# Altium footprint library PcbLib.PcbLib: 15 footprints
Each footprint in its own frame and in the unit in brackets; x right, y up, seen from the top. Pads: shape width x height; smd on the part's side, far side on the other; paste and mask are expansions set on the pad; w line width, h text height; cw(c..) or ccw(c..) is an arc to the next point about the centre after c.
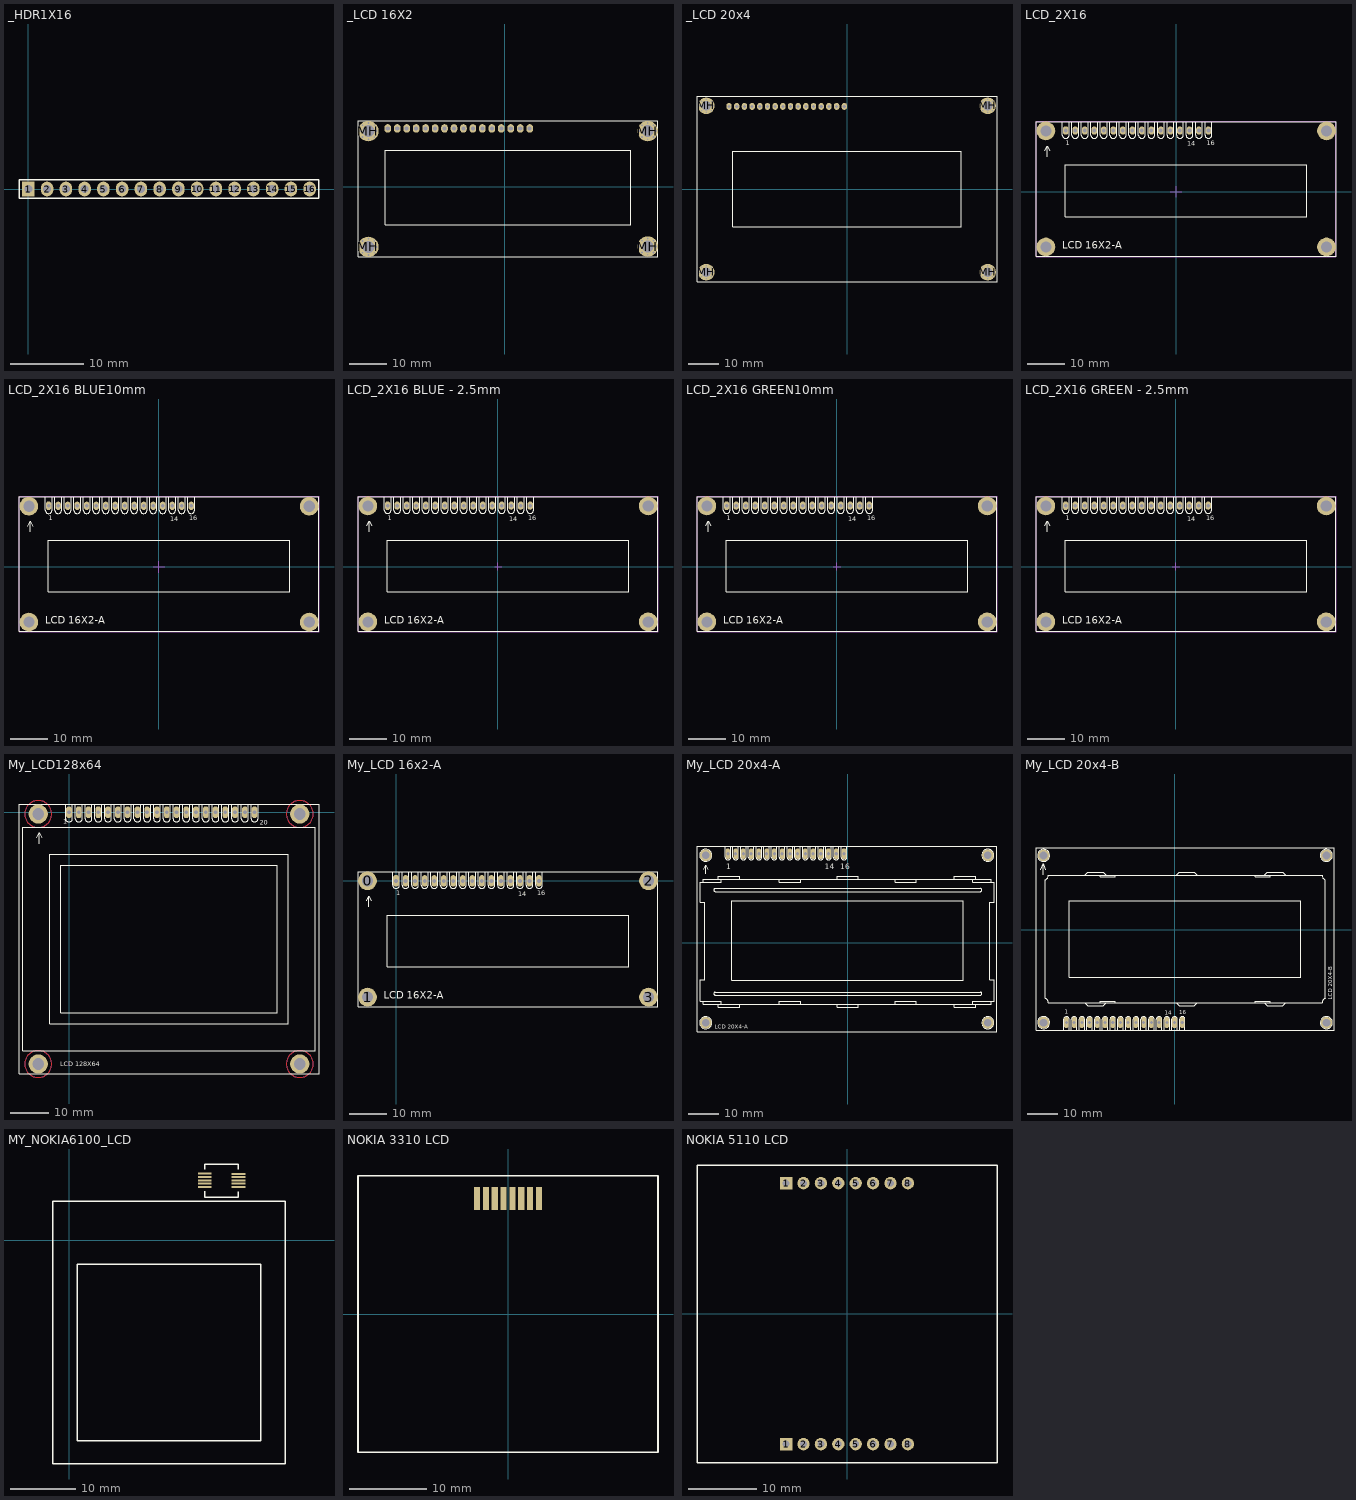
[diagram p0: the footprints below, top view; thin cyan lines are the x and y axes]

## _HDR1X16 [mm] "Connector; Header; 16 Position"
pads (16):
  rect 1.7x2 hole 1.1: 1(0,0)
  oval 1.7x2 hole 1.1: 2(2.54,0) 3(5.08,0) 4(7.62,0) 5(10.16,0) 6(12.7,0) 7(15.24,0) 8(17.78,0) 9(20.32,0) 10(22.86,0) 11(25.4,0) 12(27.94,0) 13(30.48,0) 14(33.02,0) 15(35.56,0) 16(38.1,0)
Top Overlay:
  lines w0.2: -1.27,-1.27 -1.27,1.27 0.635,1.27 39.37,1.27 39.37,-1.27 -1.27,-1.27

## _LCD 16X2 [mm]
pads (52):
  oval 1.778x2.286 hole 1.1: 1(-31.445,15.672) 2(-28.905,15.672) 3(-26.365,15.672) 4(-23.825,15.672) 5(-21.285,15.672) 6(-18.745,15.672) 7(-16.205,15.672) 8(-13.665,15.672) 9(-11.125,15.672) 10(-8.585,15.672) 11(-6.045,15.672) 12(-3.505,15.672) 13(-0.965,15.672) 14(1.575,15.672) 15(4.115,15.672) 16(6.655,15.672)
  round 0.6 hole 0.5: MH(-38.845,-16.128) MH(-38.845,14.972) MH(-38.201,-17.684) MH(-38.201,-14.573) MH(-38.201,13.416) MH(-38.201,16.527) MH(-36.645,-18.328) MH(-36.645,-13.928) MH(-36.645,12.772) MH(-36.645,17.172) MH(-35.09,-17.684) MH(-35.09,-14.573) MH(-35.09,13.416) MH(-35.09,16.527) MH(-34.445,-16.128) MH(-34.445,14.972) MH(36.155,-16.028) MH(36.155,14.972) MH(36.799,-17.584) MH(36.799,-14.473) MH(36.799,13.416) MH(36.799,16.527) MH(38.355,-18.228) MH(38.355,-13.828) MH(38.355,12.772) MH(38.355,17.172) MH(39.91,-17.584) MH(39.91,-14.473) MH(39.91,13.416) MH(39.91,16.527) MH(40.555,-16.028) MH(40.555,14.972)
  round 5.5 hole 3.2: MH(-36.645,-16.128) MH(-36.645,14.972) MH(38.355,-16.028) MH(38.355,14.972)
Top Overlay:
  lines w0.254: -39.437,-18.796 41.063,-18.796 41.063,17.704 -39.437,17.704 -39.437,-18.796 ; -32.145,-10.228 33.855,-10.228 33.855,9.772 -32.145,9.772 -32.145,-10.228

## _LCD 20x4 [mm]
pads (52):
  oval 1.778x2.286 hole 1.016: 1(-39,27.3) 2(-36.46,27.3) 3(-33.92,27.3) 4(-31.38,27.3) 5(-28.84,27.3) 6(-26.3,27.3) 7(-23.76,27.3) 8(-21.22,27.3) 9(-18.68,27.3) 10(-16.14,27.3) 11(-13.6,27.3) 12(-11.06,27.3) 13(-8.52,27.3) 14(-5.98,27.3) 15(-3.44,27.3) 16(-0.9,27.3)
  round 1 hole 0.5: MH(-48.7,-27.5) MH(-48.7,27.5) MH(-48.056,-29.056) MH(-48.056,-25.944) MH(-48.056,25.944) MH(-48.056,29.056) MH(-46.5,-29.7) MH(-46.5,-25.3) MH(-46.5,25.3) MH(-46.5,29.7) MH(-44.944,-29.056) MH(-44.944,-25.944) MH(-44.944,25.944) MH(-44.944,29.056) MH(-44.3,-27.5) MH(-44.3,27.5) MH(44.3,-27.5) MH(44.3,27.5) MH(44.944,-29.056) MH(44.944,-25.944) MH(44.944,25.944) MH(44.944,29.056) MH(46.5,-29.7) MH(46.5,-25.3) MH(46.5,25.3) MH(46.5,29.7) MH(48.056,-29.056) MH(48.056,-25.944) MH(48.056,25.944) MH(48.056,29.056) MH(48.7,-27.5) MH(48.7,27.5)
  round 5.5 hole 3.2: MH(-46.5,-27.5) MH(-46.5,27.5) MH(46.5,-27.5) MH(46.5,27.5)
Top Overlay:
  lines w0.254: -49.6,-30.6 -49.6,30.6 49.6,30.6 49.6,-30.6 -49.6,-30.6 ; -37.8,-12.5 -37.8,12.5 37.8,12.5 37.8,-12.5 -37.8,-12.5
3D body "14801-15 H.STEP": height 18.71, standoff -3.71, extent 44.2,25.2 48.8,29.8
3D body "14801-15 H.STEP": height 18.71, standoff -3.71, extent 44.2,-29.8 48.8,-25.2
3D body "14801-15 H.STEP": height 18.71, standoff -3.71, extent -48.8,-29.8 -44.2,-25.2
3D body "14801-15 H.STEP": height 18.71, standoff -3.71, extent -48.8,25.2 -44.2,29.8

## LCD_2X16 [mm] "LCD 2x16 Alphanumberic-Designer Abbas Basereh"
height 50
pads (20):
  oct 1.5x2.2 hole 1: 1(-29.464,16.3)
  oval 1.5x2.2 hole 1: 2(-26.924,16.3) 3(-24.384,16.3) 4(-21.844,16.3) 5(-19.304,16.3) 6(-16.764,16.3) 7(-14.224,16.3) 8(-11.684,16.3) 9(-9.144,16.3) 10(-6.604,16.3) 11(-4.064,16.3) 12(-1.524,16.3) 13(1.016,16.3) 14(3.556,16.3) 15(6.096,16.3) 16(8.636,16.3)
  round 5 hole 3: ""(-34.756,-14.775) ""(-34.756,16.213) ""(40.174,-14.775) ""(40.174,16.213)
Top Overlay:
  circle w0.2: c-34.796,-14.788 r1.25
  circle w0.2: c40.204,-14.788 r1.25
  circle w0.2: c-34.796,16.213 r1.25
  circle w0.2: c40.204,16.213 r1.25
  lines w0.2: -35.01,10.879 -34.375,12.149 -33.74,10.879 ; -34.375,9.337 -34.375,12.022 ; -30.353,18.669 -30.353,15.113 ccw(c-29.464,15.113) -28.575,15.113 -28.575,18.669 ; -27.813,18.669 -27.813,15.113 ccw(c-26.924,15.113) -26.035,15.113 -26.035,18.669 ; -25.273,18.669 -25.273,15.113 ccw(c-24.384,15.113) -23.495,15.113 -23.495,18.669 ; -22.733,18.669 -22.733,15.113 ccw(c-21.844,15.113) -20.955,15.113 -20.955,18.669 ; -20.193,18.669 -20.193,15.113 ccw(c-19.304,15.113) -18.415,15.113 -18.415,18.669 ; -17.653,18.669 -17.653,15.113 ccw(c-16.764,15.113) -15.875,15.113 -15.875,18.669 ; -15.113,18.669 -15.113,15.113 ccw(c-14.224,15.113) -13.335,15.113 -13.335,18.669 ; -12.573,18.669 -12.573,15.113 ccw(c-11.684,15.113) -10.795,15.113 -10.795,18.669 ; -10.033,18.669 -10.033,15.113 ccw(c-9.144,15.113) -8.255,15.113 -8.255,18.669 ; -7.493,18.669 -7.493,15.113 ccw(c-6.604,15.113) -5.715,15.113 -5.715,18.669 ; -4.953,18.669 -4.953,15.113 ccw(c-4.064,15.113) -3.175,15.113 -3.175,18.669 ; -2.413,18.669 -2.413,15.113 ccw(c-1.524,15.113) -0.635,15.113 -0.635,18.669 ; 0.127,18.669 0.127,15.113 ccw(c1.016,15.113) 1.905,15.113 1.905,18.669 ; 2.667,18.669 2.667,15.113 ccw(c3.556,15.113) 4.445,15.113 4.445,18.669 ; 5.207,18.669 5.207,15.113 ccw(c6.096,15.113) 6.985,15.113 6.985,18.669 ; 7.747,18.669 7.747,15.113 ccw(c8.636,15.113) 9.525,15.113 9.525,18.669 ; -37.296,-17.288 42.704,-17.288 42.704,18.712 -37.296,18.712 -37.296,-17.288 ; -29.546,-6.688 -29.546,7.112 34.954,7.112 34.954,-6.688 -29.546,-6.688
  text "14" at 3.048,12.192 h1.27
  text "1" at -29.464,12.446 h1.27
  text "16" at 8.128,12.446 h1.27
  text "LCD 16X2-A" at -30.438,-15.283 h1.91
Mechanical 15:
  lines w0.15: -1.5,0 1.5,0 ; 0,-1.5 0,1.5 ; -37.4,-17.4 42.7,-17.4 42.7,18.8 -37.4,18.8 -37.4,-17.4
3D body "User Library-AC162B.STEP": height 21, standoff 7.1, extent -37.35,-17.3 42.65,18.7
3D body: height 10, standoff 0, extent -37.338,13.589 -32.131,18.796
3D body: height 10, standoff 0, extent -37.338,-17.399 -32.131,-12.192
3D body: height 10, standoff 0, extent 37.592,-17.399 42.799,-12.192
3D body: height 10, standoff 0, extent 37.592,13.589 42.799,18.796

## LCD_2X16 BLUE10mm [mm] "LCD 2x16 Alphanumberic-Designer Abbas Basereh"
height 50
pads (20):
  oct 1.5x2.2 hole 1: 1(-29.464,16.3)
  oval 1.5x2.2 hole 1: 2(-26.924,16.3) 3(-24.384,16.3) 4(-21.844,16.3) 5(-19.304,16.3) 6(-16.764,16.3) 7(-14.224,16.3) 8(-11.684,16.3) 9(-9.144,16.3) 10(-6.604,16.3) 11(-4.064,16.3) 12(-1.524,16.3) 13(1.016,16.3) 14(3.556,16.3) 15(6.096,16.3) 16(8.636,16.3)
  round 5 hole 3: ""(-34.756,-14.775) ""(-34.756,16.213) ""(40.174,-14.775) ""(40.174,16.213)
Top Overlay:
  circle w0.2: c40.204,16.213 r1.25
  circle w0.2: c-34.796,16.213 r1.25
  circle w0.2: c40.204,-14.788 r1.25
  circle w0.2: c-34.796,-14.788 r1.25
  lines w0.2: -35.01,10.879 -34.375,12.149 -33.74,10.879 ; -34.375,9.337 -34.375,12.022 ; -30.353,18.669 -30.353,15.113 ccw(c-29.464,15.113) -28.575,15.113 -28.575,18.669 ; -27.813,18.669 -27.813,15.113 ccw(c-26.924,15.113) -26.035,15.113 -26.035,18.669 ; -25.273,18.669 -25.273,15.113 ccw(c-24.384,15.113) -23.495,15.113 -23.495,18.669 ; -22.733,18.669 -22.733,15.113 ccw(c-21.844,15.113) -20.955,15.113 -20.955,18.669 ; -20.193,18.669 -20.193,15.113 ccw(c-19.304,15.113) -18.415,15.113 -18.415,18.669 ; -17.653,18.669 -17.653,15.113 ccw(c-16.764,15.113) -15.875,15.113 -15.875,18.669 ; -15.113,18.669 -15.113,15.113 ccw(c-14.224,15.113) -13.335,15.113 -13.335,18.669 ; -12.573,18.669 -12.573,15.113 ccw(c-11.684,15.113) -10.795,15.113 -10.795,18.669 ; -10.033,18.669 -10.033,15.113 ccw(c-9.144,15.113) -8.255,15.113 -8.255,18.669 ; -7.493,18.669 -7.493,15.113 ccw(c-6.604,15.113) -5.715,15.113 -5.715,18.669 ; -4.953,18.669 -4.953,15.113 ccw(c-4.064,15.113) -3.175,15.113 -3.175,18.669 ; -2.413,18.669 -2.413,15.113 ccw(c-1.524,15.113) -0.635,15.113 -0.635,18.669 ; 0.127,18.669 0.127,15.113 ccw(c1.016,15.113) 1.905,15.113 1.905,18.669 ; 2.667,18.669 2.667,15.113 ccw(c3.556,15.113) 4.445,15.113 4.445,18.669 ; 5.207,18.669 5.207,15.113 ccw(c6.096,15.113) 6.985,15.113 6.985,18.669 ; 7.747,18.669 7.747,15.113 ccw(c8.636,15.113) 9.525,15.113 9.525,18.669 ; -37.296,-17.288 -37.296,18.712 42.704,18.712 42.704,-17.288 -37.296,-17.288 ; -29.546,-6.688 34.954,-6.688 34.954,7.112 -29.546,7.112 -29.546,-6.688
  text "LCD 16X2-A" at -30.438,-15.283 h1.91
  text "16" at 8.128,12.446 h1.27
  text "1" at -29.464,12.446 h1.27
  text "14" at 3.048,12.192 h1.27
Mechanical 15:
  lines w0.15: -1.5,0 1.5,0 ; -0.1,-1.6 -0.1,1.5 ; -37.4,-17.4 42.8,-17.4 42.8,18.9 -37.4,18.9 -37.4,-17.4
3D body: height 10, standoff 0, extent 37.592,13.589 42.799,18.796
3D body: height 10, standoff 0, extent 37.592,-17.399 42.799,-12.192
3D body: height 10, standoff 0, extent -37.338,-17.399 -32.131,-12.192
3D body: height 10, standoff 0, extent -37.338,13.589 -32.131,18.796
3D body "User Library-LCD-5.STEP": height 19.8, standoff 1.5, extent -37.35,-17.3 42.65,18.7
3D body: height 10, standoff 0, extent -30.25,15.25 9.75,17.75

## LCD_2X16 BLUE - 2.5mm [mm] "LCD 2x16 Alphanumberic-Designer Abbas Basereh"
height 40
pads (20):
  oct 1.5x2.2 hole 1: 1(-29.464,16.3)
  oval 1.5x2.2 hole 1: 2(-26.924,16.3) 3(-24.384,16.3) 4(-21.844,16.3) 5(-19.304,16.3) 6(-16.764,16.3) 7(-14.224,16.3) 8(-11.684,16.3) 9(-9.144,16.3) 10(-6.604,16.3) 11(-4.064,16.3) 12(-1.524,16.3) 13(1.016,16.3) 14(3.556,16.3) 15(6.096,16.3) 16(8.636,16.3)
  round 5 hole 3: ""(-34.756,-14.775) ""(-34.756,16.213) ""(40.174,-14.775) ""(40.174,16.213)
Top Overlay:
  circle w0.2: c40.204,16.213 r1.25
  circle w0.2: c-34.796,16.213 r1.25
  circle w0.2: c40.204,-14.788 r1.25
  circle w0.2: c-34.796,-14.788 r1.25
  lines w0.2: -35.01,10.879 -34.375,12.149 -33.74,10.879 ; -34.375,9.337 -34.375,12.022 ; -30.353,18.669 -30.353,15.113 ccw(c-29.464,15.113) -28.575,15.113 -28.575,18.669 ; -27.813,18.669 -27.813,15.113 ccw(c-26.924,15.113) -26.035,15.113 -26.035,18.669 ; -25.273,18.669 -25.273,15.113 ccw(c-24.384,15.113) -23.495,15.113 -23.495,18.669 ; -22.733,18.669 -22.733,15.113 ccw(c-21.844,15.113) -20.955,15.113 -20.955,18.669 ; -20.193,18.669 -20.193,15.113 ccw(c-19.304,15.113) -18.415,15.113 -18.415,18.669 ; -17.653,18.669 -17.653,15.113 ccw(c-16.764,15.113) -15.875,15.113 -15.875,18.669 ; -15.113,18.669 -15.113,15.113 ccw(c-14.224,15.113) -13.335,15.113 -13.335,18.669 ; -12.573,18.669 -12.573,15.113 ccw(c-11.684,15.113) -10.795,15.113 -10.795,18.669 ; -10.033,18.669 -10.033,15.113 ccw(c-9.144,15.113) -8.255,15.113 -8.255,18.669 ; -7.493,18.669 -7.493,15.113 ccw(c-6.604,15.113) -5.715,15.113 -5.715,18.669 ; -4.953,18.669 -4.953,15.113 ccw(c-4.064,15.113) -3.175,15.113 -3.175,18.669 ; -2.413,18.669 -2.413,15.113 ccw(c-1.524,15.113) -0.635,15.113 -0.635,18.669 ; 0.127,18.669 0.127,15.113 ccw(c1.016,15.113) 1.905,15.113 1.905,18.669 ; 2.667,18.669 2.667,15.113 ccw(c3.556,15.113) 4.445,15.113 4.445,18.669 ; 5.207,18.669 5.207,15.113 ccw(c6.096,15.113) 6.985,15.113 6.985,18.669 ; 7.747,18.669 7.747,15.113 ccw(c8.636,15.113) 9.525,15.113 9.525,18.669 ; -37.296,-17.288 -37.296,18.712 42.704,18.712 42.704,-17.288 -37.296,-17.288 ; -29.546,-6.688 34.954,-6.688 34.954,7.112 -29.546,7.112 -29.546,-6.688
  text "LCD 16X2-A" at -30.438,-15.283 h1.91
  text "16" at 8.128,12.446 h1.27
  text "1" at -29.464,12.446 h1.27
  text "14" at 3.048,12.192 h1.27
Mechanical 15:
  lines w0.15: -0.9,0 1,0 ; 0,-1 0,1 ; -37.4,-17.4 -37.4,18.8 42.8,18.8 42.8,-17.4 -37.4,-17.4
3D body "User Library-LCD-5.STEP": height 12.3, standoff -6, extent -37.35,-17.3 42.65,18.7

## LCD_2X16 GREEN10mm [mm] "LCD 2x16 Alphanumberic-Designer Abbas Basereh"
height 50
pads (20):
  oct 1.5x2.2 hole 1: 1(-29.464,16.3)
  oval 1.5x2.2 hole 1: 2(-26.924,16.3) 3(-24.384,16.3) 4(-21.844,16.3) 5(-19.304,16.3) 6(-16.764,16.3) 7(-14.224,16.3) 8(-11.684,16.3) 9(-9.144,16.3) 10(-6.604,16.3) 11(-4.064,16.3) 12(-1.524,16.3) 13(1.016,16.3) 14(3.556,16.3) 15(6.096,16.3) 16(8.636,16.3)
  round 5 hole 3: ""(-34.756,-14.775) ""(-34.756,16.213) ""(40.174,-14.775) ""(40.174,16.213)
Top Overlay:
  circle w0.2: c-34.796,-14.788 r1.25
  circle w0.2: c40.204,-14.788 r1.25
  circle w0.2: c-34.796,16.213 r1.25
  circle w0.2: c40.204,16.213 r1.25
  lines w0.2: -35.01,10.879 -34.375,12.149 -33.74,10.879 ; -34.375,9.337 -34.375,12.022 ; -30.353,18.669 -30.353,15.113 ccw(c-29.464,15.113) -28.575,15.113 -28.575,18.669 ; -27.813,18.669 -27.813,15.113 ccw(c-26.924,15.113) -26.035,15.113 -26.035,18.669 ; -25.273,18.669 -25.273,15.113 ccw(c-24.384,15.113) -23.495,15.113 -23.495,18.669 ; -22.733,18.669 -22.733,15.113 ccw(c-21.844,15.113) -20.955,15.113 -20.955,18.669 ; -20.193,18.669 -20.193,15.113 ccw(c-19.304,15.113) -18.415,15.113 -18.415,18.669 ; -17.653,18.669 -17.653,15.113 ccw(c-16.764,15.113) -15.875,15.113 -15.875,18.669 ; -15.113,18.669 -15.113,15.113 ccw(c-14.224,15.113) -13.335,15.113 -13.335,18.669 ; -12.573,18.669 -12.573,15.113 ccw(c-11.684,15.113) -10.795,15.113 -10.795,18.669 ; -10.033,18.669 -10.033,15.113 ccw(c-9.144,15.113) -8.255,15.113 -8.255,18.669 ; -7.493,18.669 -7.493,15.113 ccw(c-6.604,15.113) -5.715,15.113 -5.715,18.669 ; -4.953,18.669 -4.953,15.113 ccw(c-4.064,15.113) -3.175,15.113 -3.175,18.669 ; -2.413,18.669 -2.413,15.113 ccw(c-1.524,15.113) -0.635,15.113 -0.635,18.669 ; 0.127,18.669 0.127,15.113 ccw(c1.016,15.113) 1.905,15.113 1.905,18.669 ; 2.667,18.669 2.667,15.113 ccw(c3.556,15.113) 4.445,15.113 4.445,18.669 ; 5.207,18.669 5.207,15.113 ccw(c6.096,15.113) 6.985,15.113 6.985,18.669 ; 7.747,18.669 7.747,15.113 ccw(c8.636,15.113) 9.525,15.113 9.525,18.669 ; -37.296,-17.288 42.704,-17.288 42.704,18.712 -37.296,18.712 -37.296,-17.288 ; -29.546,-6.688 -29.546,7.112 34.954,7.112 34.954,-6.688 -29.546,-6.688
  text "14" at 3.048,12.192 h1.27
  text "1" at -29.464,12.446 h1.27
  text "16" at 8.128,12.446 h1.27
  text "LCD 16X2-A" at -30.438,-15.283 h1.91
Mechanical 15:
  lines w0.15: -1,0 1,0 ; 0,-1 0,1 ; -37.4,-17.4 -37.4,18.8 42.8,18.8 42.8,-17.4 -37.3,-17.4 -37.4,-17.4
3D body: height 10, standoff 0, extent -30.25,15.25 9.75,17.75
3D body "User Library-LCD 16x2 JHD162A.STEP": height 20.6, standoff 7.45, extent -37.35,-17.3 42.65,18.7
3D body: height 10, standoff 0, extent -37.338,13.589 -32.131,18.796
3D body: height 10, standoff 0, extent -37.338,-17.399 -32.131,-12.192
3D body: height 10, standoff 0, extent 37.592,-17.399 42.799,-12.192
3D body: height 10, standoff 0, extent 37.592,13.589 42.799,18.796

## LCD_2X16 GREEN - 2.5mm [mm] "LCD 2x16 Alphanumberic-Designer Abbas Basereh"
height 40
pads (20):
  oct 1.5x2.2 hole 1: 1(-29.464,16.3)
  oval 1.5x2.2 hole 1: 2(-26.924,16.3) 3(-24.384,16.3) 4(-21.844,16.3) 5(-19.304,16.3) 6(-16.764,16.3) 7(-14.224,16.3) 8(-11.684,16.3) 9(-9.144,16.3) 10(-6.604,16.3) 11(-4.064,16.3) 12(-1.524,16.3) 13(1.016,16.3) 14(3.556,16.3) 15(6.096,16.3) 16(8.636,16.3)
  round 5 hole 3: ""(-34.756,-14.775) ""(-34.756,16.213) ""(40.174,-14.775) ""(40.174,16.213)
Top Overlay:
  circle w0.2: c-34.796,-14.788 r1.25
  circle w0.2: c40.204,-14.788 r1.25
  circle w0.2: c-34.796,16.213 r1.25
  circle w0.2: c40.204,16.213 r1.25
  lines w0.2: -35.01,10.879 -34.375,12.149 -33.74,10.879 ; -34.375,9.337 -34.375,12.022 ; -30.353,18.669 -30.353,15.113 ccw(c-29.464,15.113) -28.575,15.113 -28.575,18.669 ; -27.813,18.669 -27.813,15.113 ccw(c-26.924,15.113) -26.035,15.113 -26.035,18.669 ; -25.273,18.669 -25.273,15.113 ccw(c-24.384,15.113) -23.495,15.113 -23.495,18.669 ; -22.733,18.669 -22.733,15.113 ccw(c-21.844,15.113) -20.955,15.113 -20.955,18.669 ; -20.193,18.669 -20.193,15.113 ccw(c-19.304,15.113) -18.415,15.113 -18.415,18.669 ; -17.653,18.669 -17.653,15.113 ccw(c-16.764,15.113) -15.875,15.113 -15.875,18.669 ; -15.113,18.669 -15.113,15.113 ccw(c-14.224,15.113) -13.335,15.113 -13.335,18.669 ; -12.573,18.669 -12.573,15.113 ccw(c-11.684,15.113) -10.795,15.113 -10.795,18.669 ; -10.033,18.669 -10.033,15.113 ccw(c-9.144,15.113) -8.255,15.113 -8.255,18.669 ; -7.493,18.669 -7.493,15.113 ccw(c-6.604,15.113) -5.715,15.113 -5.715,18.669 ; -4.953,18.669 -4.953,15.113 ccw(c-4.064,15.113) -3.175,15.113 -3.175,18.669 ; -2.413,18.669 -2.413,15.113 ccw(c-1.524,15.113) -0.635,15.113 -0.635,18.669 ; 0.127,18.669 0.127,15.113 ccw(c1.016,15.113) 1.905,15.113 1.905,18.669 ; 2.667,18.669 2.667,15.113 ccw(c3.556,15.113) 4.445,15.113 4.445,18.669 ; 5.207,18.669 5.207,15.113 ccw(c6.096,15.113) 6.985,15.113 6.985,18.669 ; 7.747,18.669 7.747,15.113 ccw(c8.636,15.113) 9.525,15.113 9.525,18.669 ; -37.296,-17.288 42.704,-17.288 42.704,18.712 -37.296,18.712 -37.296,-17.288 ; -29.546,-6.688 -29.546,7.112 34.954,7.112 34.954,-6.688 -29.546,-6.688
  text "14" at 3.048,12.192 h1.27
  text "1" at -29.464,12.446 h1.27
  text "16" at 8.128,12.446 h1.27
  text "LCD 16X2-A" at -30.438,-15.283 h1.91
Mechanical 15:
  lines w0.15: -1,0 1,0 ; 0,-1 0,1 ; -37.4,-17.4 -37.4,18.8 42.8,18.8 42.8,-17.4 -37.4,-17.4
3D body "User Library-LCD 16x2 JHD162A.STEP": height 13.1, standoff -0.05, extent -37.35,-17.3 42.65,18.7

## My_LCD128x64 [mm]
pads (24):
  oct 1.508x3.016 hole 1: 1(0,0) 2(2.54,0) 3(5.08,0) 4(7.62,0) 5(10.16,0) 6(12.7,0) 7(15.24,0) 8(17.78,0) 9(20.32,0) 10(22.86,0) 11(25.4,0) 12(27.94,0) 13(30.48,0) 14(33.02,0) 15(35.56,0) 16(38.1,0) 17(40.64,0) 18(43.18,0) 19(45.72,0) 20(48.26,0)
  round 5 hole 3 unplated: ""(-8,-65.46) ""(-8,-0.46) ""(60,-65.46) ""(60,-0.46)
Top Layer:
  circle w0.203: c-8,-0.46 r3.502
  circle w0.203: c60,-0.46 r3.5
  circle w0.203: c-8,-65.46 r3.5
  circle w0.203: c60,-65.46 r3.502
Bottom Layer:
  circle w0.203: c-8,-0.46 r3.501
  circle w0.203: c60,-0.46 r3.502
  circle w0.203: c60,-65.46 r3.502
  circle w0.203: c-8,-65.46 r3.505
Top Overlay:
  lines w0.127: -8.382,-6.604 -7.747,-5.334 -7.112,-6.604 ; -7.747,-8.146 -7.747,-5.461 ; -0.889,1.905 -0.889,-1.651 ccw(c0,-1.651) 0.889,-1.651 0.889,1.905 ; 1.651,1.905 1.651,-1.651 ccw(c2.54,-1.651) 3.429,-1.651 3.429,1.905 ; 4.191,1.905 4.191,-1.651 ccw(c5.08,-1.651) 5.969,-1.651 5.969,1.905 ; 6.731,1.905 6.731,-1.651 ccw(c7.62,-1.651) 8.509,-1.651 8.509,1.905 ; 9.271,1.905 9.271,-1.651 ccw(c10.16,-1.651) 11.049,-1.651 11.049,1.905 ; 11.811,1.905 11.811,-1.651 ccw(c12.7,-1.651) 13.589,-1.651 13.589,1.905 ; 14.351,1.905 14.351,-1.651 ccw(c15.24,-1.651) 16.129,-1.651 16.129,1.905 ; 16.891,1.905 16.891,-1.651 ccw(c17.78,-1.651) 18.669,-1.651 18.669,1.905 ; 19.431,1.905 19.431,-1.651 ccw(c20.32,-1.651) 21.209,-1.651 21.209,1.905 ; 21.971,1.905 21.971,-1.651 ccw(c22.86,-1.651) 23.749,-1.651 23.749,1.905 ; 24.511,1.905 24.511,-1.651 ccw(c25.4,-1.651) 26.289,-1.651 26.289,1.905 ; 27.051,1.905 27.051,-1.651 ccw(c27.94,-1.651) 28.829,-1.651 28.829,1.905 ; 29.591,1.905 29.591,-1.651 ccw(c30.48,-1.651) 31.369,-1.651 31.369,1.905 ; 32.131,1.905 32.131,-1.651 ccw(c33.02,-1.651) 33.909,-1.651 33.909,1.905 ; 34.671,1.905 34.671,-1.651 ccw(c35.56,-1.651) 36.449,-1.651 36.449,1.905 ; 37.211,1.905 37.211,-1.651 ccw(c38.1,-1.651) 38.989,-1.651 38.989,1.905 ; 39.751,1.905 39.751,-1.651 ccw(c40.64,-1.651) 41.529,-1.651 41.529,1.905 ; 42.291,1.905 42.291,-1.651 ccw(c43.18,-1.651) 44.069,-1.651 44.069,1.905 ; 44.831,1.905 44.831,-1.651 ccw(c45.72,-1.651) 46.609,-1.651 46.609,1.905 ; 47.371,1.905 47.371,-1.651 ccw(c48.26,-1.651) 49.149,-1.651 49.149,1.905
  lines w0.203: -13,-67.96 -13,2.04 65,2.04 65,-67.96 -13,-67.96 ; -12,-61.96 -12,-3.96 64,-3.96 64,-61.96 -12,-61.96 ; -5,-54.96 -5,-10.96 57,-10.96 57,-54.96 -5,-54.96 ; -2.13,-52.14 -2.13,-13.79 54.14,-13.79 54.14,-52.14 -2.13,-52.14
  text "20" at 49.53,-3.302 h1.27
  text "1" at -1.524,-3.048 h1.27
  text "LCD 128X64" at -2.286,-66.04 h1.27

## My_LCD 16x2-A [mil]
pads (20):
  round 196.85 hole 118.11: 0(-300,0) 1(-300,-1220) 2(2650,0) 3(2650,-1220)
  oct 60x120 hole 40: 1(0,0)
  oval 60x120 hole 40: 2(100,0) 3(200,0) 4(300,0) 5(400,0) 6(500,0) 7(600,0) 8(700,0) 9(800,0) 10(900,0) 11(1000,0) 12(1100,0) 13(1200,0) 14(1300,0) 15(1400,0) 16(1500,0)
Top Overlay:
  circle w5: c-301.58,-1220.5 r49.21
  circle w5: c2651.18,-1220.5 r49.21
  circle w5: c-301.58,0 r49.21
  circle w5: c2651.18,0 r49.21
  lines w5: -310,-210 -285,-160 -260,-210 ; -285,-270.7 -285,-165 ; -35,95 -35,-45 ccw(c0,-45) 35,-45 35,95 ; 65,95 65,-45 ccw(c100,-45) 135,-45 135,95 ; 165,95 165,-45 ccw(c200,-45) 235,-45 235,95 ; 265,95 265,-45 ccw(c300,-45) 335,-45 335,95 ; 365,95 365,-45 ccw(c400,-45) 435,-45 435,95 ; 465,95 465,-45 ccw(c500,-45) 535,-45 535,95 ; 565,95 565,-45 ccw(c600,-45) 635,-45 635,95 ; 665,95 665,-45 ccw(c700,-45) 735,-45 735,95 ; 765,95 765,-45 ccw(c800,-45) 835,-45 835,95 ; 865,95 865,-45 ccw(c900,-45) 935,-45 935,95 ; 965,95 965,-45 ccw(c1000,-45) 1035,-45 1035,95 ; 1065,95 1065,-45 ccw(c1100,-45) 1135,-45 1135,95 ; 1165,95 1165,-45 ccw(c1200,-45) 1235,-45 1235,95 ; 1265,95 1265,-45 ccw(c1300,-45) 1335,-45 1335,95 ; 1365,95 1365,-45 ccw(c1400,-45) 1435,-45 1435,95 ; 1465,95 1465,-45 ccw(c1500,-45) 1535,-45 1535,95 ; -400,-1318.93 2749.6,-1318.93 2749.6,98.4 -400,98.4 -400,-1318.93 ; -94.88,-901.6 -94.88,-358.3 2444.49,-358.3 2444.49,-901.6 -94.88,-901.6
  text "14" at 1280,-160 h50
  text "1" at 0,-150 h50
  text "16" at 1480,-150 h50
  text "LCD 16X2-A" at -130,-1240 h75

## My_LCD 20x4-A [mil]
pads (20):
  oct 60x140 hole 40: 1(-1550.5,1150) 2(-1450.5,1150) 3(-1350.5,1150) 4(-1250.5,1150) 5(-1150.5,1150) 6(-1050.5,1150) 7(-950.5,1150) 8(-850.5,1150) 9(-750.5,1150) 10(-650.5,1150) 11(-550.5,1150) 12(-450.5,1150) 13(-350.5,1150) 14(-250.5,1150) 15(-150.5,1150) 16(-50.5,1150)
  round 150 hole 100: P$1(-1837.5,-1035) P$2(1808.5,-1035) P$3(1808.5,1130.5) P$4(-1837.5,1130)
Top Overlay:
  drawing of 163 lines, arcs and shapes, not listed
  text "LCD 20X4-A" at -1719.69,-1112.2 h50
  text "14" at -300,950 h70
  text "16" at -100,950 h70
  text "1" at -1575,950 h70

## My_LCD 20x4-B [mil]
pads (20):
  oct 60x140 hole 40: 1(-1400.5,-1199) 2(-1300.5,-1199) 3(-1200.5,-1199) 4(-1100.5,-1199) 5(-1000.5,-1199) 6(-900.5,-1199) 7(-800.5,-1199) 8(-700.5,-1199) 9(-600.5,-1199) 10(-500.5,-1199) 11(-400.5,-1199) 12(-300.5,-1199) 13(-200.5,-1199) 14(-100.5,-1199) 15(-0.5,-1199) 16(99.5,-1199)
  round 150 hole 100: P$1(-1695.5,965.5) P$2(-1695.5,-1199.5) P$3(1966,-1200) P$4(1966,965.5)
Top Overlay:
  circle w5: c-1695.5,-1199.5 r78
  circle w5: c1966,-1199.5 r78
  circle w5: c1966,965.5 r78
  circle w5: c-1695.5,965.5 r78
  lines w5: -1734.95,-1199.6 -1656.21,-1199.6 ; -1734.95,965.8 -1656.21,965.8 ; -1730,778.7 -1700,859 -1675,778.7 ; -1700,716.5 -1700,844 ; -1695.58,-1239 -1695.58,-1160.2 ; -1695.58,926.4 -1695.58,1005.1 ; -1673.23,-885.9 -1673.23,649.6 ; -1673.23,-885.83 cw(c-1692.91,-941.6) -1633.86,-944.88 -1161.42,-944.9 ; -1673.23,649.53 ccw(c-1692.91,705.3) -1633.86,708.58 -1161.42,708.6 ; -1435,-1295 -1435,-1155 cw(c-1400,-1157.5) -1365,-1160 -1365,-1295 ; -1335,-1295 -1335,-1155 cw(c-1300,-1157.5) -1265,-1160 -1265,-1295 ; -1235,-1295 -1235,-1155 cw(c-1200,-1157.5) -1165,-1160 -1165,-1295 ; -1135,-1295 -1135,-1155 cw(c-1100,-1157.5) -1065,-1160 -1065,-1295 ; -1035,-1295 -1035,-1155 cw(c-1000,-1157.5) -965,-1160 -965,-1295 ; -935,-1295 -935,-1155 cw(c-900,-1157.5) -865,-1160 -865,-1295 ; -835,-1295 -835,-1155 cw(c-800,-1157.5) -765,-1160 -765,-1295 ; -735,-1295 -735,-1155 cw(c-700,-1157.5) -665,-1160 -665,-1295 ; -635,-1295 -635,-1155 cw(c-600,-1157.5) -565,-1160 -565,-1295 ; -535,-1295 -535,-1155 cw(c-500,-1157.5) -465,-1160 -465,-1295 ; -435,-1295 -435,-1155 cw(c-400,-1157.5) -365,-1160 -365,-1295 ; -335,-1295 -335,-1155 cw(c-300,-1157.5) -265,-1160 -265,-1295 ; -235,-1295 -235,-1155 cw(c-200,-1157.5) -165,-1160 -165,-1295 ; -135,-1295 -135,-1155 cw(c-100,-1157.5) -65,-1160 -65,-1295 ; -35,-1295 -35,-1155 cw(c0,-1157.5) 35,-1160 35,-1295 ; 65,-1295 65,-1155 cw(c100,-1157.5) 135,-1160 135,-1295 ; 1631.19,316.1 1631.19,375.2 ; 1926.47,-1199.6 2005.21,-1199.6 ; 1926.47,965.8 2005.21,965.8 ; 1948.82,-885.9 1948.82,649.6 ; 1948.82,-885.83 ccw(c1968.5,-941.6) 1909.45,-944.88 1437.01,-944.9 ; 1948.82,649.53 cw(c1968.5,705.3) 1909.45,708.58 1437.01,708.6 ; 1965.84,-1239 1965.84,-1160.2 ; 1965.84,926.4 1965.84,1005.1 ; -1161.42,-944.9 -964.57,-944.9 ; -1161.42,-944.9 -1122.05,-984.3 -925.2,-984.3 -885.83,-944.9 ; -1161.42,708.6 -964.57,708.6 ; -1161.42,708.6 -1122.05,748 -925.2,748 -885.83,708.6 ; -964.57,-944.9 -885.83,-944.9 ; -964.57,-944.9 -964.57,-925.2 -767.72,-925.2 -767.72,-944.9 ; -964.57,708.6 -885.83,708.6 ; -964.57,708.6 -964.57,688.9 -767.72,688.9 -767.72,708.6 ; -885.83,-944.9 -767.72,-944.9 ; -885.83,708.6 -767.72,708.6 ; -767.72,-944.9 19.68,-944.9 ; -767.72,708.6 19.68,708.6 ; 19.68,-944.9 295.27,-944.9 ; 19.68,-944.9 59.05,-984.3 255.9,-984.3 295.27,-944.9 ; 19.68,708.6 295.27,708.6 ; 19.68,708.6 59.05,748 255.9,748 295.27,708.6 ; 295.27,-944.9 1043.31,-944.9 ; 295.27,708.6 1043.31,708.6 ; 1043.31,-944.9 1161.42,-944.9 ; 1043.31,-944.9 1043.31,-925.2 1240.16,-925.2 1240.16,-944.9 ; 1043.31,708.6 1161.42,708.6 ; 1043.31,708.6 1043.31,688.9 1240.16,688.9 1240.16,708.6 ; 1161.42,-944.9 1240.16,-944.9 ; 1161.42,-944.9 1200.79,-984.3 1397.64,-984.3 1437.01,-944.9 ; 1161.42,708.6 1240.16,708.6 ; 1161.42,708.6 1200.79,748 1397.64,748 1437.01,708.6 ; 1240.16,-944.9 1437.01,-944.9 ; 1240.16,708.6 1437.01,708.6 ; 1631.19,375.2 -1360.93,375.2 -1360.93,-609.1 1631.19,-609.1 1631.19,375.2 ; -1794,-1298 2064.27,-1298 2064.27,1064.2 -1794,1064.2 -1794,-1298
  text "14" at -130,-1100 h50
  text "1" at -1420,-1084 h50
  text "16" at 60,-1094 h50
  text "LCD 20X4-B" at 2040.16,-903.2 h50

## MY_NOKIA6100_LCD [mm]
height 2
pads (10):
  rect 2.1x0.3 smd: 1(20.699,10.148) 2(20.699,9.648) 3(20.699,9.148) 4(20.699,8.648) 5(20.699,8.148) 6(25.833,8.14) 7(25.833,8.64) 8(25.833,9.14) 9(25.833,9.64) 10(25.833,10.14)
Top Overlay:
  lines w0.127: 25.4,-3.683 25.654,-3.683
  lines w0.203: 20.694,6.557 20.694,7.447 ; 20.701,6.553 25.781,6.553 ; 20.701,11.633 25.781,11.633 ; 20.704,10.837 20.704,11.627 ; 25.784,10.837 25.784,11.617 ; 25.794,6.557 25.794,7.427 ; -2.54,-34.163 -2.54,5.969 33.02,5.969 33.02,-34.163 -2.54,-34.163 ; 1.27,-30.607 1.27,-3.683 25.654,-3.683 29.21,-3.683 29.21,-30.607 1.27,-30.607

## NOKIA 3310 LCD [mm] "NOKIA 3310 LCD"
height 3
pads (8):
  rect 0.8x3 smd: 1(4.025,15) 2(2.875,15) 3(1.725,15) 4(0.575,15) 5(-0.575,15) 6(-1.725,15) 7(-2.875,15) 8(-4.025,15)
Top Overlay:
  lines w0.2: -19.5,-18 19.5,-18 19.5,18 -19.5,18 -19.5,-18
3D body "NOKIA 3310.STEP": height 2.06, standoff 0.04, extent -19.25,-17.75 19.25,17.75

## NOKIA 5110 LCD [mm] "NOKIA 5110 LCD"
height 10.254
pads (16):
  rect 1.8x1.8 hole 1: 1(-8.89,-19.05) 1(-8.89,19.05)
  round 1.8 hole 1: 2(-6.35,-19.05) 2(-6.35,19.05) 3(-3.81,-19.05) 3(-3.81,19.05) 4(-1.27,-19.05) 4(-1.27,19.05) 5(1.27,-19.05) 5(1.27,19.05) 6(3.81,-19.05) 6(3.81,19.05) 7(6.35,-19.05) 7(6.35,19.05) 8(8.89,-19.05) 8(8.89,19.05)
Top Overlay:
  lines w0.2: -21.9,-21.8 21.9,-21.8 21.9,21.7 -21.9,21.7 -21.9,-21.8
3D body "NOKIA 5110 BreakOut Board.STEP": height 5.05, standoff 0.05, extent -21.8,-21.65 21.8,21.65